# Altium footprint library andylib.PcbLib: 158 footprints (part 7 of 10)
Each footprint in its own frame and in the unit in brackets; x right, y up, seen from the top. Pads: shape width x height; smd on the part's side, far side on the other; paste and mask are expansions set on the pad; w line width, h text height; cw(c..) or ccw(c..) is an arc to the next point about the centre after c.
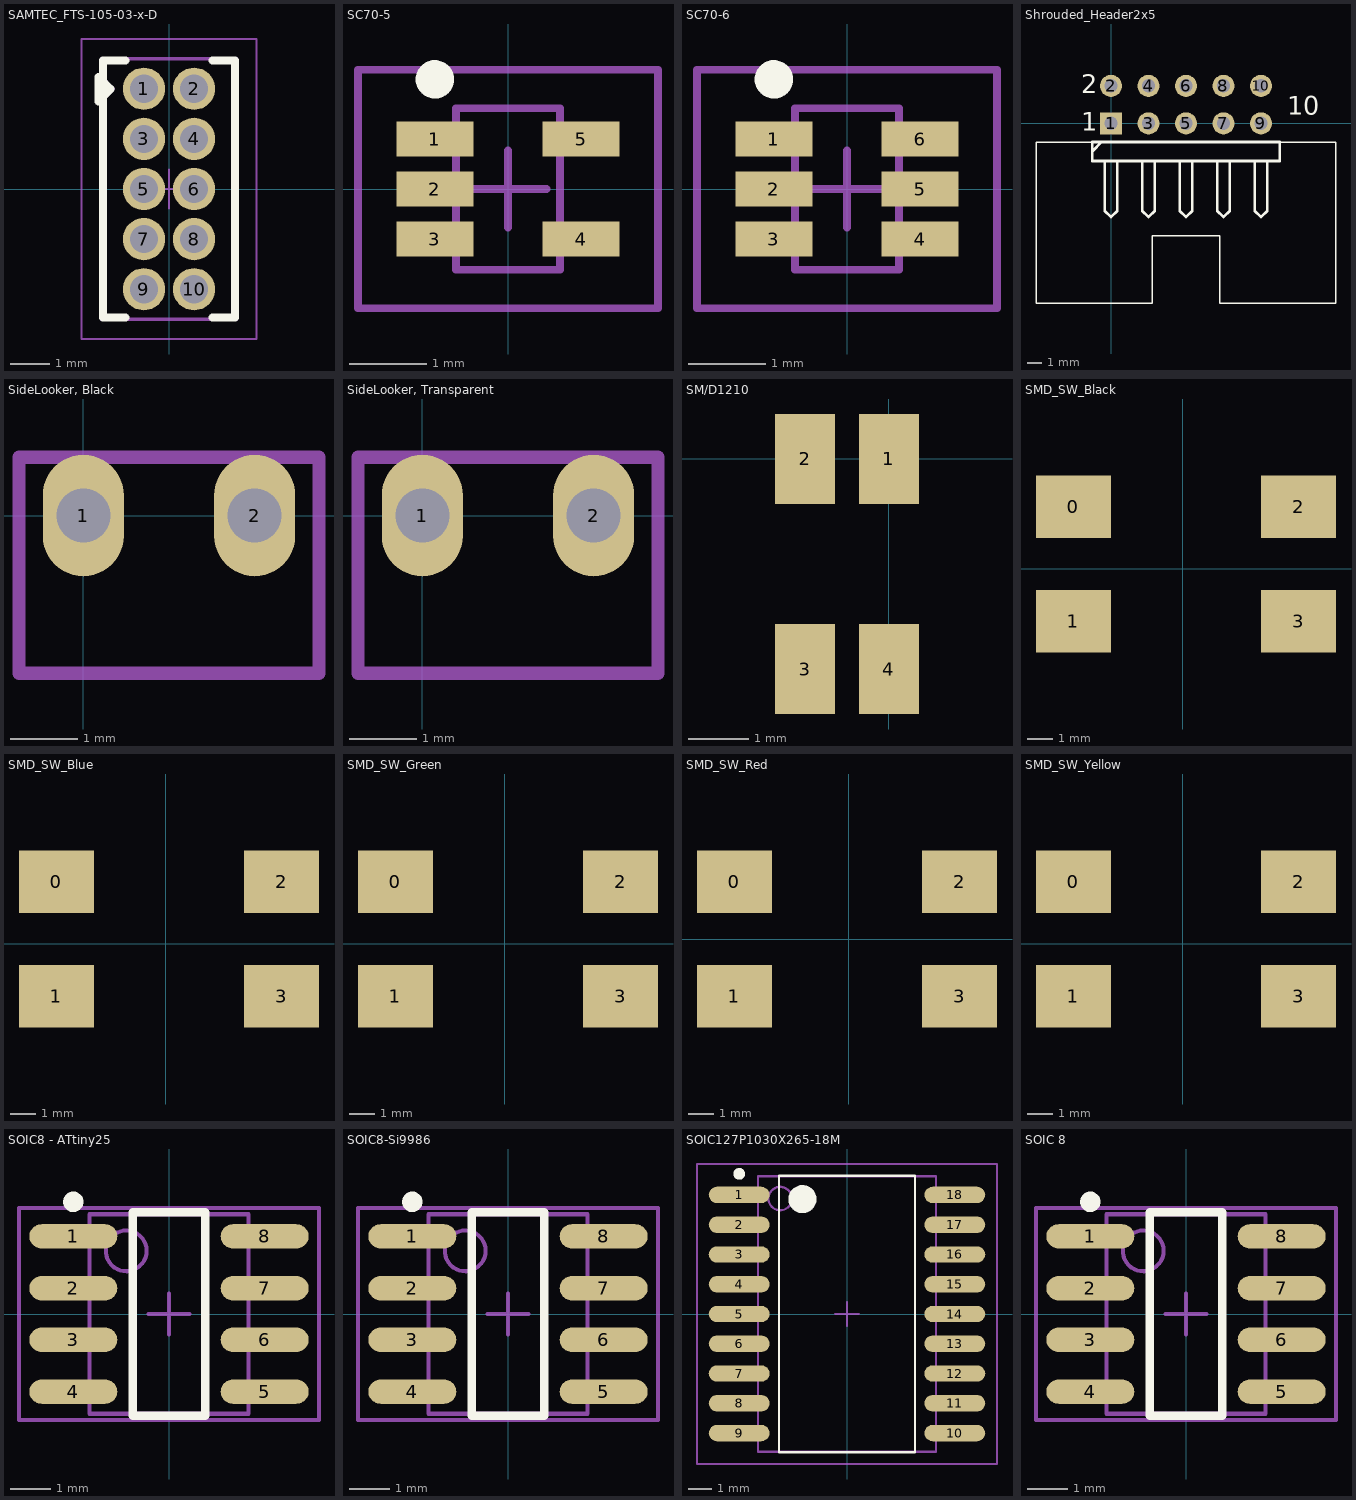
[diagram p6: the footprints below, top view; thin cyan lines are the x and y axes]

## SAMTEC_FTS-105-03-x-D [mm] "2 x 5 Header FTS Series, 1.27 x 1.27 mm pitch, Thruhole, Lead style 03 (1.65mm), 2.51mm height, 1.75A"
height 2.51
pads (10):
  round 1.07 hole 0.71: 1(-0.635,2.54) 2(0.635,2.54) 3(-0.635,1.27) 4(0.635,1.27) 5(-0.635,0) 6(0.635,0) 7(-0.635,-1.27) 8(0.635,-1.27) 9(-0.635,-2.54) 10(0.635,-2.54)
Top Overlay:
  lines w0.2: -1.66,2.465 -1.66,2.581 ; -1.1,-3.255 -1.675,-3.255 -1.675,3.255 -1.1,3.255 ; 1.1,-3.255 1.675,-3.255 1.675,3.255 1.1,3.255 ; -1.785,2.22 -1.475,2.53 -1.785,2.84 -1.785,2.22
Mechanical 13:
  lines w0.1: -1.715,2.24 -1.415,2.54 -1.715,2.84 ; -1.715,2.34 -1.515,2.54 -1.715,2.74 ; -1.715,2.44 -1.615,2.54 -1.715,2.64 ; -1.715,-3.3 -1.715,3.3 1.715,3.3 1.715,-3.3 -1.715,-3.3 ; -0.84,-2.745 -0.84,-2.335 -0.43,-2.335 -0.43,-2.745 -0.84,-2.745 ; -0.84,-1.475 -0.43,-1.475 -0.43,-1.065 -0.84,-1.065 -0.84,-1.475 ; -0.84,-0.205 -0.84,0.205 -0.43,0.205 -0.43,-0.205 -0.84,-0.205 ; -0.84,1.065 -0.43,1.065 -0.43,1.475 -0.84,1.475 -0.84,1.065 ; -0.84,2.335 -0.43,2.335 -0.43,2.745 -0.84,2.745 -0.84,2.335 ; 0.43,-2.745 0.43,-2.335 0.84,-2.335 0.84,-2.745 0.43,-2.745 ; 0.43,-1.475 0.84,-1.475 0.84,-1.065 0.43,-1.065 0.43,-1.475 ; 0.43,-0.205 0.43,0.205 0.84,0.205 0.84,-0.205 0.43,-0.205 ; 0.43,1.065 0.84,1.065 0.84,1.475 0.43,1.475 0.43,1.065 ; 0.43,2.335 0.43,2.745 0.84,2.745 0.84,2.335 0.43,2.335
  text ".Designator" at -0.2,0.85 h0.5
Mechanical 15:
  lines w0.05: -0.5,0 0,0 ; 0,-0.5 0,0 ; 0,0.5 0,0 ; 0.5,0 0,0 ; -2.215,-3.8 2.215,-3.8 2.215,3.8 -2.215,3.8 -2.215,-3.8
3D body: height 2.51, standoff -2.54, extent 0.43,2.335 0.84,2.745
3D body: height 0.86, standoff 0, extent -1.715,-3.3 1.715,3.3
3D body: height 2.51, standoff -2.54, extent 0.43,1.065 0.84,1.475
3D body: height 2.51, standoff -2.54, extent -0.84,2.335 -0.43,2.745
3D body: height 2.51, standoff -2.54, extent -0.84,1.065 -0.43,1.475
3D body: height 2.51, standoff -2.54, extent -0.84,-0.205 -0.43,0.205
3D body: height 2.51, standoff -2.54, extent 0.43,-0.205 0.84,0.205
3D body: height 2.51, standoff -2.54, extent 0.43,-1.475 0.84,-1.065
3D body: height 2.51, standoff -2.54, extent -0.84,-1.475 -0.43,-1.065
3D body: height 2.51, standoff -2.54, extent -0.84,-2.745 -0.43,-2.335
3D body: height 2.51, standoff -2.54, extent 0.43,-2.745 0.84,-2.335

## SC70-5 [mm] "SOT23, 5-Leads, Body 2.1x2.1mm (max), Pitch 0.65mm, IPC Low Density"
height 1.1
pads (5):
  rect 1x0.45 smd: 1(-0.95,0.65) 2(-0.95,0) 3(-0.95,-0.65) 4(0.95,-0.65) 5(0.95,0.65)
Top Overlay:
  circle w0.25: c-0.95,1.425 r0.125
Mechanical 13:
  lines w0.1: -0.675,-1.05 0.675,-1.05 0.675,1.05 -0.675,1.05 -0.675,-1.05
Mechanical 15:
  lines w0.1: -0.5,0 0.5,0 ; 0,-0.5 0,0.5 ; -1.95,-1.55 1.95,-1.55 1.95,1.55 -1.95,1.55 -1.95,-1.55
3D body: height 0.95, standoff 0, extent -1.05,-1.009 1.05,0.991

## SC70-6 [mm] "SOT23, 6-Leads, Body 2.1x2.1mm (max), Pitch 0.65mm, IPC Low Density"
height 1.1
pads (6):
  rect 1x0.45 smd: 1(-0.95,0.65) 2(-0.95,0) 3(-0.95,-0.65) 4(0.95,-0.65) 5(0.95,0) 6(0.95,0.65)
Top Overlay:
  circle w0.25: c-0.95,1.425 r0.125
Mechanical 13:
  lines w0.1: -0.675,-1.05 0.675,-1.05 0.675,1.05 -0.675,1.05 -0.675,-1.05
Mechanical 15:
  lines w0.1: -0.5,0 0.5,0 ; 0,-0.5 0,0.5 ; -1.95,-1.55 1.95,-1.55 1.95,1.55 -1.95,1.55 -1.95,-1.55
3D body: height 0.95, standoff 0, extent -1.05,-1.009 1.05,0.991

## Shrouded_Header2x5 [mm] "Connector; Header; 5x2 Position; Right Angle"
height 3.6
pads (10):
  rect 1.5x1.5 hole 0.9: 1(0,0)
  round 1.5 hole 0.9: 2(0,2.54) 3(2.54,0) 4(2.54,2.54) 5(5.08,0) 6(5.08,2.54) 7(7.62,0) 8(7.62,2.54) 9(10.16,0) 10(10.16,2.54)
Top Overlay:
  lines w0.1: -5.08,-12.192 -5.08,-1.27 15.24,-1.27 15.24,-12.192 7.366,-12.192 7.366,-7.62 2.794,-7.62 2.794,-12.192 -5.08,-12.192
  lines w0.2: -1.27,-1.905 -0.635,-1.27 ; -0.423,-2.54 -0.423,-5.927 0,-6.35 0.423,-5.927 0.423,-2.54 ; 2.117,-2.54 2.117,-5.927 2.54,-6.35 2.963,-5.927 2.963,-2.54 ; 4.657,-2.54 4.657,-5.927 5.08,-6.35 5.503,-5.927 5.503,-2.54 ; 7.197,-2.54 7.197,-5.927 7.62,-6.35 8.043,-5.927 8.043,-2.54 ; 9.737,-2.54 9.737,-5.927 10.16,-6.35 10.583,-5.927 10.583,-2.54 ; -1.27,-2.54 -1.27,-1.27 11.43,-1.27 11.43,-2.54 -1.27,-2.54
  text "10" at 11.94,0.588 h1.27
  text "1" at -2.032,-0.508 h1.27
  text "2" at -2.032,2.032 h1.27
3D body: height 8.7, standoff -2.39, extent -4.92,-11.992 15.08,3.048

## SideLooker, Black [mm] "Side Looker Package for IR Receiver"
pads (2):
  oval 1.2x1.8 hole 0.8: 1(0,0) 2(2.54,0)
Mechanical 15:
  lines w0.2: -0.953,-2.337 3.492,-2.337 3.492,0.864 -0.953,0.864 -0.953,-2.337
3D body: height 7.62, standoff -10.16, extent -0.924,-2.327 3.516,0.788

## SideLooker, Transparent [mm] "Side Looker Package for IR Emitter"
pads (2):
  oval 1.2x1.8 hole 0.8: 1(0,0) 2(2.54,0)
Mechanical 15:
  lines w0.2: -0.953,-2.337 3.492,-2.337 3.492,0.864 -0.953,0.864 -0.953,-2.337
3D body: height 7.62, standoff -10.16, extent -0.924,-2.327 3.516,0.788

## SM/D1210 [mm]
pads (4):
  rect 1x1.5 smd: 1(0,0) 2(-1.4,0) 3(-1.4,-3.5) 4(0,-3.5)
3D body: height 1.09, standoff 0, extent -2.083,-3.34 0.609,-0.165

## SMD_SW_Black [mm]
pads (4):
  rect 3x2.5 smd: 0(-4.372,2.486) 1(-4.372,-2.086) 2(4.645,2.486) 3(4.645,-2.086)
3D body: height 5, standoff 0, extent -4.355,-2.8 4.645,3.2

## SMD_SW_Blue [mm]
pads (4):
  rect 3x2.5 smd: 0(-4.372,2.486) 1(-4.372,-2.086) 2(4.645,2.486) 3(4.645,-2.086)
3D body: height 5, standoff 0, extent -4.355,-2.8 4.645,3.2

## SMD_SW_Green [mm]
pads (4):
  rect 3x2.5 smd: 0(-4.372,2.486) 1(-4.372,-2.086) 2(4.645,2.486) 3(4.645,-2.086)
3D body: height 5, standoff 0, extent -4.355,-2.8 4.645,3.2

## SMD_SW_Red [mm]
pads (4):
  rect 3x2.5 smd: 0(-4.572,2.286) 1(-4.572,-2.286) 2(4.445,2.286) 3(4.445,-2.286)
3D body: height 5, standoff 0, extent -4.555,-3 4.445,3

## SMD_SW_Yellow [mm]
pads (4):
  rect 3x2.5 smd: 0(-4.372,2.486) 1(-4.372,-2.086) 2(4.645,2.486) 3(4.645,-2.086)
3D body: height 5, standoff 0, extent -4.45,-2.85 4.55,3.15

## SOIC8 - ATtiny25 [mm] "8-Pin Small Outline Integrated Circuit 1.27 mm Pitch, IPC High Density"
height 1.75
pads (8):
  oval 2.159x0.6 smd: 1(-2.35,1.905) 2(-2.35,0.635) 3(-2.35,-0.635) 4(-2.35,-1.905) 5(2.35,-1.905) 6(2.35,-0.635) 7(2.35,0.635) 8(2.35,1.905)
Top Overlay:
  circle w0.25: c-2.35,2.755 r0.125
  lines w0.2: -0.889,-2.5 -0.889,2.5 0.889,2.5 0.889,-2.5 -0.889,-2.5
Mechanical 13:
  circle w0.1: c-1.05,1.55 r0.5
  lines w0.1: -1.95,-2.45 -1.95,2.45 1.95,2.45 1.95,-2.45 -1.95,-2.45
Mechanical 15:
  lines w0.1: -0.5,0 0.5,0 ; 0,-0.5 0,0.5 ; -3.683,-2.6 -3.683,2.6 3.683,2.6 3.683,-2.6 -3.683,-2.6
3D body: height 1.75, standoff 0, extent -3.101,-2.5 3.101,2.5

## SOIC8-Si9986 [mm] "8-Pin Small Outline Integrated Circuit 1.27 mm Pitch, IPC High Density"
height 1.75
pads (8):
  oval 2.159x0.6 smd: 1(-2.35,1.905) 2(-2.35,0.635) 3(-2.35,-0.635) 4(-2.35,-1.905) 5(2.35,-1.905) 6(2.35,-0.635) 7(2.35,0.635) 8(2.35,1.905)
Top Overlay:
  circle w0.25: c-2.35,2.755 r0.125
  lines w0.2: -0.889,-2.5 0.889,-2.5 0.889,2.5 -0.889,2.5 -0.889,-2.5
Mechanical 13:
  circle w0.1: c-1.05,1.55 r0.5
  lines w0.1: -1.95,-2.45 1.95,-2.45 1.95,2.45 -1.95,2.45 -1.95,-2.45
Mechanical 15:
  lines w0.1: -0.5,0 0.5,0 ; 0,-0.5 0,0.5 ; -3.683,-2.6 3.683,-2.6 3.683,2.6 -3.683,2.6 -3.683,-2.6
3D body: height 1.76, standoff 0.01, extent -3.154,-2.46 3.048,2.54

## SOIC127P1030X265-18M [mm] "SOIC, 18-Leads, Body 11.8x7.6mm (max), Pitch 1.27mm, IPC Low Density"
height 2.65
pads (18):
  oval 2.6x0.7 smd: 1(-4.6,5.08) 2(-4.6,3.81) 3(-4.6,2.54) 4(-4.6,1.27) 5(-4.6,0) 6(-4.6,-1.27) 7(-4.6,-2.54) 8(-4.6,-3.81) 9(-4.6,-5.08) 10(4.6,-5.08) 11(4.6,-3.81) 12(4.6,-2.54) 13(4.6,-1.27) 14(4.6,0) 15(4.6,1.27) 16(4.6,2.54) 17(4.6,3.81) 18(4.6,5.08)
Top Overlay:
  circle w0.25: c-4.6,5.98 r0.125
  circle w0.6: c-1.9,4.9 r0.3
  lines w0.1: -2.9,-5.9 -2.9,5.9 2.9,5.9 2.9,-5.9 -2.9,-5.9
Mechanical 13:
  circle w0.1: c-2.85,4.925 r0.5
  lines w0.1: -3.8,-5.875 -3.8,5.875 3.8,5.875 3.8,-5.875 -3.8,-5.875
Mechanical 15:
  lines w0.1: -0.5,0 0.5,0 ; 0,-0.5 0,0.5 ; -6.4,-6.4 -6.4,6.4 6.4,6.4 6.4,-6.4 -6.4,-6.4
3D body: height 2.8, standoff 0, extent -5.258,-6.93 5.098,6.97

## SOIC 8 [mm] "8-Pin Small Outline Integrated Circuit 1.27 mm Pitch, IPC High Density"
height 1.75
pads (8):
  oval 2.159x0.6 smd: 1(-2.35,1.905) 2(-2.35,0.635) 3(-2.35,-0.635) 4(-2.35,-1.905) 5(2.35,-1.905) 6(2.35,-0.635) 7(2.35,0.635) 8(2.35,1.905)
Top Overlay:
  circle w0.25: c-2.35,2.755 r0.125
  lines w0.2: -0.889,-2.5 0.889,-2.5 0.889,2.5 -0.889,2.5 -0.889,-2.5
Mechanical 13:
  circle w0.1: c-1.05,1.55 r0.5
  lines w0.1: -1.95,-2.45 1.95,-2.45 1.95,2.45 -1.95,2.45 -1.95,-2.45
Mechanical 15:
  lines w0.1: -0.5,0 0.5,0 ; 0,-0.5 0,0.5 ; -3.683,-2.6 3.683,-2.6 3.683,2.6 -3.683,2.6 -3.683,-2.6
3D body: height 1.74, standoff 0, extent -3.101,-2.531 3.101,2.469